# Altium footprint library TrackCommanderCar_ControlPart.PcbLib: 56 footprints (part 1 of 4)
Each footprint in its own frame and in the unit in brackets; x right, y up, seen from the top. Pads: shape width x height; smd on the part's side, far side on the other; paste and mask are expansions set on the pad; w line width, h text height; cw(c..) or ccw(c..) is an arc to the next point about the centre after c.
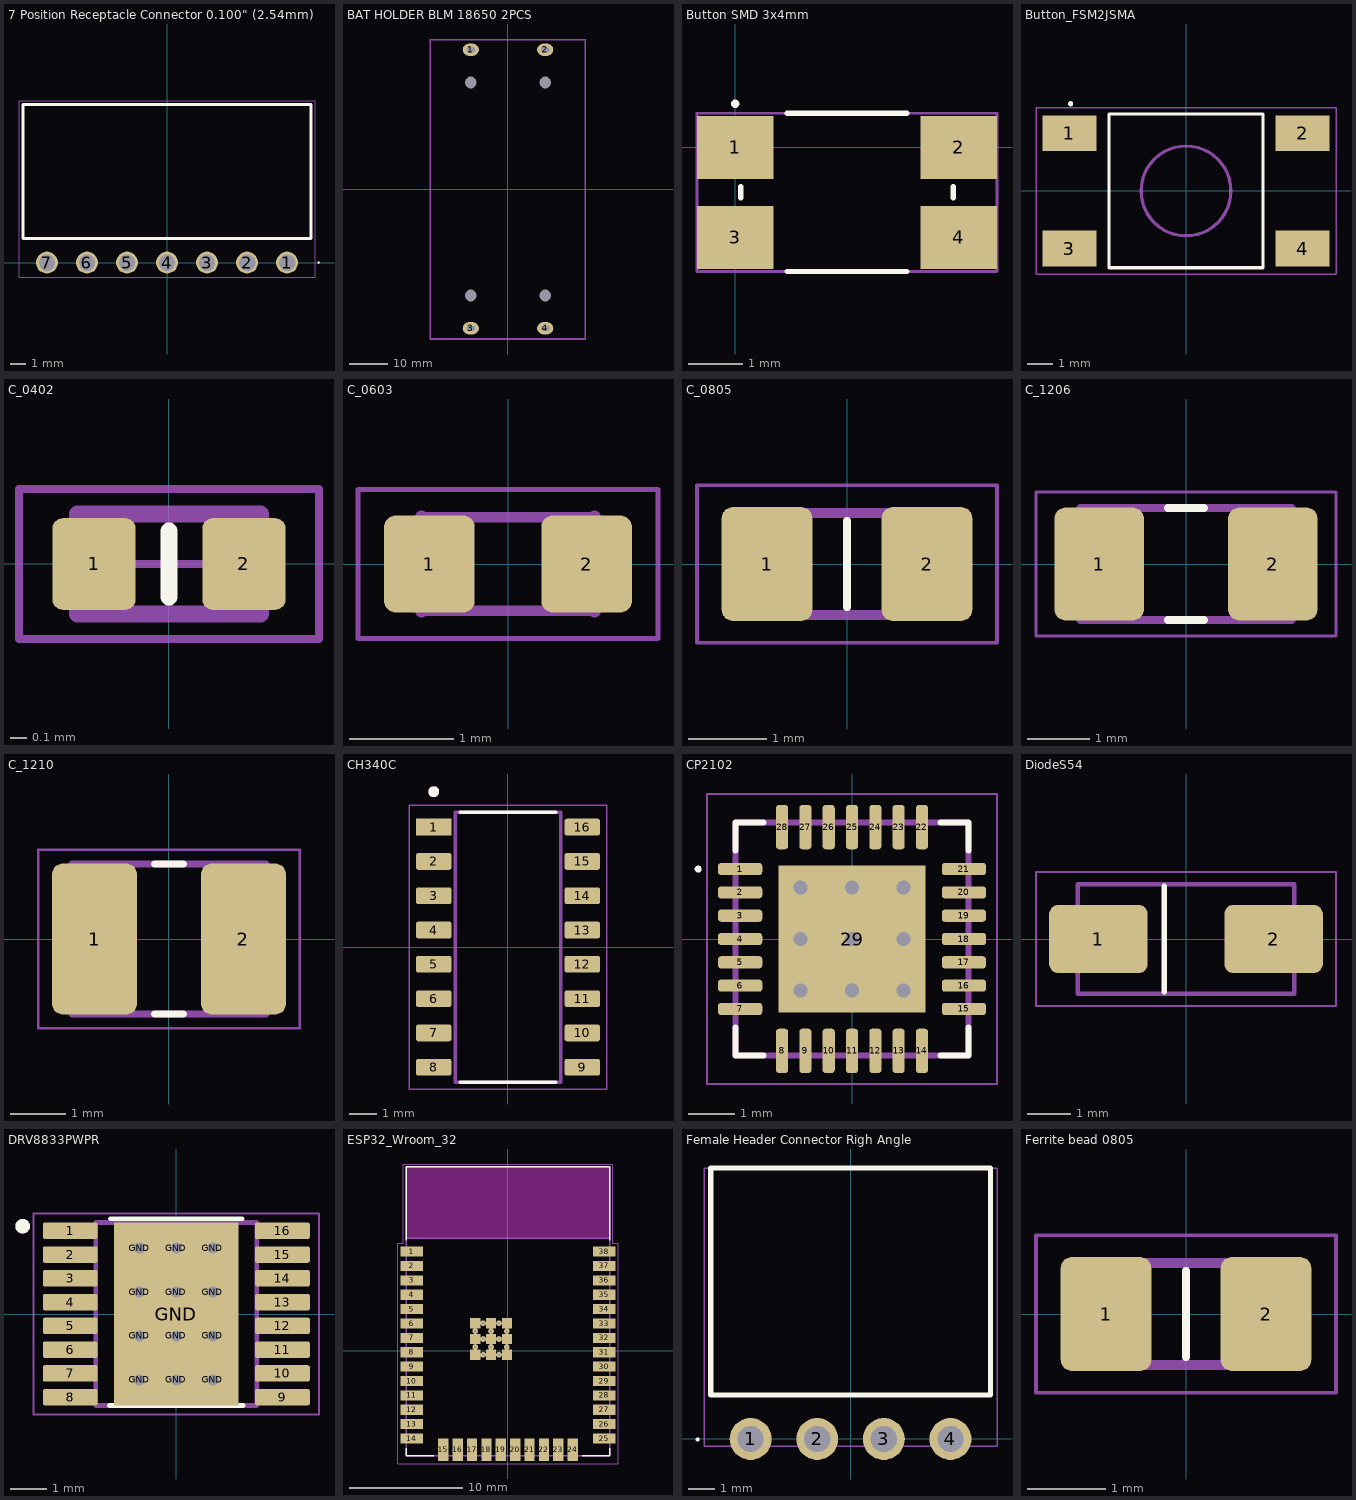
[diagram p0: the footprints below, top view; thin cyan lines are the x and y axes]

## 7 Position Receptacle Connector 0.100" (2.54mm) Through Hole, Right Angle [mm] "7 Position Receptacle Connector 0.100\" (2.54mm) Through Hole, Right Angle"
pads (7):
  round 1.39 hole 1.04: 1(7.62,0) 2(5.08,0) 3(2.54,0) 4(0,0) 5(-2.54,0) 6(-5.08,0) 7(-7.62,0)
Top Overlay:
  circle w0.1: c9.62,0 r0.025
  lines w0.2: -9.145,1.524 9.145,1.524 9.145,10.034 -9.145,10.034 -9.145,1.524
Top Assembly (Mech13):
  lines w0.1: -9.145,1.524 -9.145,10.034 ; -9.145,1.524 9.145,1.524 ; -9.145,1.524 -9.145,10.034 ; -9.145,10.034 9.145,10.034 ; -9.145,10.034 9.145,10.034 ; 9.145,1.524 9.145,10.034 ; 9.145,1.524 9.145,10.034
Mechanical 15:
  lines w0.05: -9.395,-0.945 9.395,-0.945 9.395,10.284 -9.395,10.284 -9.395,-0.945
3D body "SSW-107-02-T-S-RA.stp": height 2.46, standoff -2.48, extent -9.144,-0.203 9.144,10.033

## BAT HOLDER BLM 18650 2PCS [mm]
pads (8):
  oval 4.2x3.2 hole 1.2 slot 2.2 at 0 deg mask+0.07: 1(-9.7,36.3) 2(9.7,36.3) 3(-9.7,-36.3) 4(9.7,-36.3)
  round 0.55 hole 3.1 unplated mask+0.07: ""(-9.7,-27.8) ""(-9.7,27.8) ""(9.7,-27.8) ""(9.7,27.8)
Top Assembly (Mech13):
  lines w0.2: -20.1,-38.9 -20.1,38.9 20.1,38.9 20.1,-38.9 -20.1,-38.9
Mechanical 15:
  lines w0.15: -20.3,-39.1 -20.3,39.1 20.3,39.1 20.3,-39.1 -20.3,-39.1
3D body "Generic Li Ion 18650 cell.step": height 22.99, standoff 5.01, extent 0.5,-32.7 18.5,32.3
3D body "Generic Li Ion 18650 cell.step": height 22.99, standoff 5.01, extent -18.6,-32.7 -0.6,32.3
3D body "KLS5-18650-002-D.STEP": height 21, standoff -3.99, extent -20.1,-38.9 20.1,38.9

## Button SMD 3x4mm [mm] "Button SMD 3x4mm, Height 2.5 mm."
pads (4):
  rect 1.4x1.15 smd mask+0.1: 1(0,0) 2(4.1,0) 3(0,-1.65) 4(4.1,-1.65)
Top Overlay:
  circle w0.1: c0,0.8 r0.025
  lines w0.1: 0.1,-0.925 0.1,-0.725 ; 0.95,-2.275 3.15,-2.275 ; 0.95,0.625 3.15,0.625 ; 4,-0.925 4,-0.725
Mechanical 15:
  lines w0.05: -0.7,-2.275 4.8,-2.275 4.8,0.625 -0.7,0.625 -0.7,-2.275
  text ".Designator" at 0.63,-1.139 h0.6
3D body "KMR211NGLFS--3DModel-STEP-56544.STEP": height 1.9, standoff 0, extent -0.25,-2.225 4.35,0.575

## Button_FSM2JSMA [mm]
pads (4):
  rect 2.1x1.4 smd: 1(-4.55,2.25) 2(4.55,2.25) 3(-4.55,-2.25) 4(4.55,-2.25)
Top Overlay:
  circle w0.1: c-4.5,3.4 r0.05
  lines w0.127: -3,-3 3,-3 3,3 -3,3 -3,-3
Top Assembly (Mech13):
  circle w0.127: c0,0 r1.75
Mechanical 15:
  lines w0.05: -5.85,-3.25 5.85,-3.25 5.85,3.25 -5.85,3.25 -5.85,-3.25
3D body "step_temp.STEP": height 4.59, standoff 0, extent -5,-3 5,3

## C_0402 [mm]
pads (2):
  rrect25% 0.5x0.55 smd: 1(-0.45,0) 2(0.45,0)
Top Overlay:
  lines w0.1: 0,-0.2 0,0.2
Top Assembly:
  lines w0.1: -0.55,-0.3 -0.55,0.3 0.55,0.3 0.55,-0.3 -0.55,-0.3
Mechanical 15:
  lines w0.05: -0.275,0 0.275,0 ; 0,-0.275 0,0.275 ; -0.9,-0.45 0.9,-0.45 0.9,0.45 -0.9,0.45 -0.9,-0.45
  text ".Designator" at -1.27,-0.127 h0.6
3D body "CAPC1005X60N EIA 0402.STEP": height 0.6, standoff 0, extent -0.5,-0.25 0.5,0.25

## C_0603 [mm]
pads (2):
  rrect25% 0.87x0.93 smd mask+0.07: 1(-0.755,0) 2(0.755,0)
Top Assembly (Mech13):
  lines w0.1: -0.83,-0.45 0.83,-0.45 ; -0.83,0.45 0.83,0.45
  lines w0.127: -0.83,-0.45 -0.83,0.45 ; 0.83,-0.45 0.83,0.45
Mechanical 15:
  lines w0.05: -1.44,-0.715 1.44,-0.715 1.44,0.715 -1.44,0.715 -1.44,-0.715
3D body "step_temp.STEP": height 0.97, standoff 0, extent -0.8,-0.4 0.8,0.4

## C_0805 [mm]
pads (2):
  rrect25% 1.15x1.45 smd mask+0.07: 1(-1.016,0)
  rrect25% 1.15x1.45 smd paste-2539.97 mask+0.07: 2(1.016,0)
Top Overlay:
  lines w0.1: 0,-0.55 0,0.55
Top Paste:
  region: 0.441,-0.437 0.441,0.437 0.441,0.466 0.452,0.521 0.474,0.574 0.505,0.621 0.545,0.661 0.592,0.692 0.645,0.714 0.7,0.725 0.728,0.725 1.304,0.725 1.332,0.725 1.387,0.714 1.44,0.692 1.487,0.661 1.527,0.621 1.558,0.574 1.58,0.521 1.591,0.466 1.591,0.437 1.591,-0.437 1.591,-0.466 1.58,-0.521 1.558,-0.574 1.527,-0.621 1.487,-0.661 1.44,-0.692 1.387,-0.714 1.332,-0.725 1.304,-0.725 0.728,-0.725 0.7,-0.725 0.645,-0.714 0.592,-0.692 0.545,-0.661 0.505,-0.621 0.474,-0.574 0.452,-0.521 0.441,-0.466
Top Assembly (Mech13):
  region: -0.5,-0.65 -1,-0.65 -1,0.65 -0.5,0.65
  region: 1,-0.65 0.5,-0.65 0.5,0.65 1,0.65
  lines w0.127: -1,-0.65 1,-0.65 1,0.65 -1,0.65 -1,-0.65
Mechanical 15:
  lines w0.05: -1.905,-1 1.905,-1 1.905,1 -1.905,1 -1.905,-1
3D body "step_temp.STEP": height 1.52, standoff 0, extent -1.005,-0.625 1.005,0.625

## C_1206 [mm]
pads (2):
  rrect25% 1.44x1.82 smd mask+0.07: 1(-1.397,0) 2(1.397,0)
Top Overlay:
  lines w0.127: -0.29,-0.9 0.29,-0.9 ; -0.29,0.9 0.29,0.9
Top Assembly (Mech13):
  lines w0.127: -1.7,-0.9 -1.7,0.9 1.7,0.9 1.7,-0.9 -1.7,-0.9
Mechanical 15:
  lines w0.05: -2.413,-1.158 -2.413,1.158 2.413,1.158 2.413,-1.158 -2.413,-1.158
3D body "step_temp.STEP": height 1.9, standoff 0, extent -1.6,-0.8 1.6,0.8

## C_1210 [mm]
pads (2):
  rrect25% 1.53x2.72 smd mask+0.07: 1(-1.341,0) 2(1.341,0)
Top Overlay:
  lines w0.127: -0.26,-1.35 0.26,-1.35 ; -0.26,1.35 0.26,1.35
Top Assembly (Mech13):
  lines w0.127: -1.75,-1.35 -1.75,1.35 1.75,1.35 1.75,-1.35 -1.75,-1.35
Mechanical 15:
  lines w0.05: -2.355,-1.608 -2.355,1.608 2.355,1.608 2.355,-1.608 -2.355,-1.608
3D body "step_temp.STEP": height 2.65, standoff 0, extent -1.6,-1.25 1.6,1.25

## CH340C [mm]
pads (16):
  rect 1.31x0.62 smd: 1(-2.75,4.445)
  rrect25% 1.31x0.62 smd: 2(-2.75,3.175) 3(-2.75,1.905) 4(-2.75,0.635) 5(-2.75,-0.635) 6(-2.75,-1.905) 7(-2.75,-3.175) 8(-2.75,-4.445) 9(2.75,-4.445) 10(2.75,-3.175) 11(2.75,-1.905) 12(2.75,-0.635) 13(2.75,0.635) 14(2.75,1.905) 15(2.75,3.175) 16(2.75,4.445)
Top Overlay:
  circle w0.2: c-2.75,5.755 r0.1
  lines w0.127: -1.775,-5 1.775,-5 -1.775,-5 ; -1.775,5 1.775,5 -1.775,5
Top Assembly (Mech13):
  circle w0.2: c-2.75,5.755 r0.1
  lines w0.127: -1.95,-5 1.95,-5 1.95,5 -1.95,5 -1.95,-5
Mechanical 15:
  lines w0.05: -3.655,-5.25 -3.655,5.25 3.655,5.25 3.655,-5.25 -3.655,-5.25
3D body "step_temp.STEP": height 1.8, standoff 0, extent -3,-5 3,5

## CP2102 [mm]
pads (29):
  rrect50% 0.95x0.26 smd: 1(-2.4,1.5) 2(-2.4,1) 3(-2.4,0.5) 4(-2.4,0) 5(-2.4,-0.5) 6(-2.4,-1) 7(-2.4,-1.5) 15(2.4,-1.5) 16(2.4,-1) 17(2.4,-0.5) 18(2.4,0) 19(2.4,0.5) 20(2.4,1) 21(2.4,1.5)
  rrect50% 0.26x0.95 smd: 8(-1.5,-2.4) 9(-1,-2.4) 10(-0.5,-2.4) 11(0,-2.4) 12(0.5,-2.4) 13(1,-2.4) 14(1.5,-2.4) 22(1.5,2.4) 23(1,2.4) 24(0.5,2.4) 25(0,2.4) 26(-0.5,2.4) 27(-1,2.4) 28(-1.5,2.4)
  rect 3.15x3.15 smd paste-0.585: 29(0,0)
via -1.1,1.1 diameter 0.6 hole 0.3
via -1.1,-1.1 diameter 0.6 hole 0.3
via 0,-1.1 diameter 0.6 hole 0.3
via 1.1,-1.1 diameter 0.6 hole 0.3
via -1.1,0 diameter 0.6 hole 0.3
via 0,0 diameter 0.6 hole 0.3
via 1.1,0 diameter 0.6 hole 0.3
via 0,1.1 diameter 0.6 hole 0.3
via 1.1,1.1 diameter 0.6 hole 0.3
Top Overlay:
  circle w0.1: c-3.3,1.5 r0.025
  lines w0.127: -2.5,-1.9 -2.5,-2.5 -1.9,-2.5 ; -2.5,1.9 -2.5,2.5 -1.9,2.5 ; 1.9,-2.5 2.5,-2.5 2.5,-1.9 ; 1.9,2.5 2.5,2.5 2.5,1.9
Top Assembly (Mech13):
  lines w0.127: -2.5,-2.5 -2.5,2.5 2.5,2.5 2.5,-2.5 -2.5,-2.5
Mechanical 15:
  lines w0.05: -3.11,-3.11 -3.11,3.11 3.11,3.11 3.11,-3.11 -3.11,-3.11
3D body "step_temp.STEP": height 1, standoff 0, extent -2.5,-2.5 2.5,2.5

## DiodeS54 [mm]
pads (2):
  rrect25% 2.25x1.55 smd mask+0.07: 1(-2,0) 2(2,0)
Top Overlay:
  lines w0.127: -0.5,-1.2 -0.5,1.2
Top Assembly (Mech13):
  lines w0.1: -2.475,-1.25 -2.475,1.25 2.475,1.25 2.475,-1.25 -2.475,-1.25
Mechanical 15:
  lines w0.05: -3.425,-1.53 3.425,-1.53 3.425,1.53 -3.425,1.53 -3.425,-1.53
3D body "step_temp.STEP": height 2.2, standoff 0, extent -2.475,-1.25 2.475,1.25

## DRV8833PWPR [mm]
pads (29):
  rrect25% 1.5x0.45 smd mask+0.05: 1(-2.9,2.275) 2(-2.9,1.625) 3(-2.9,0.975) 4(-2.9,0.325) 5(-2.9,-0.325) 6(-2.9,-0.975) 7(-2.9,-1.625) 8(-2.9,-2.275) 9(2.9,-2.275) 10(2.9,-1.625) 11(2.9,-0.975) 12(2.9,-0.325) 13(2.9,0.325) 14(2.9,0.975) 15(2.9,1.625) 16(2.9,2.275)
  round 0.6 hole 0.3 mask+0: GND(-1,-1.8) GND(-1,-0.6) GND(-1,0.6) GND(-1,1.8) GND(0,-1.8) GND(0,-0.6) GND(0,0.6) GND(0,1.8) GND(1,-1.8) GND(1,-0.6) GND(1,0.6) GND(1,1.8)
  rect 3.4x5 smd paste-2539.97 mask+0: GND(0,0)
Top Overlay:
  circle w0.2: c-4.2,2.4 r0.1
  lines w0.127: -1.83,-2.5 1.83,-2.5 ; -1.8,2.6 1.8,2.6
Top Paste:
  region: 1.23,-1.155 -1.23,-1.155 -1.23,1.155 1.23,1.155
Top Solder:
  region: 1.23,-1.155 -1.23,-1.155 -1.23,1.155 1.23,1.155
Top Assembly (Mech13):
  circle w0.2: c-4.2,2.4 r0.1
  lines w0.127: -2.2,-2.5 2.2,-2.5 2.2,2.5 -2.2,2.5 -2.2,-2.5
Mechanical 15:
  lines w0.05: -3.9,-2.75 3.9,-2.75 3.9,2.75 -3.9,2.75 -3.9,-2.75
3D body "step_temp.STEP": height 1.2, standoff 0, extent -3.2,-2.5 3.2,2.5

## ESP32_Wroom_32 [mm]
pads (59):
  rect 2x0.9 smd mask+0.07: 1(-8.5,8.755) 2(-8.5,7.485) 3(-8.5,6.215) 4(-8.5,4.945) 5(-8.5,3.675) 6(-8.5,2.405) 7(-8.5,1.135) 8(-8.5,-0.135) 9(-8.5,-1.405) 10(-8.5,-2.675) 11(-8.5,-3.945) 12(-8.5,-5.215) 13(-8.5,-6.485) 14(-8.5,-7.755) 25(8.5,-7.755) 26(8.5,-6.485) 27(8.5,-5.215) 28(8.5,-3.945) 29(8.5,-2.675) 30(8.5,-1.405) 31(8.5,-0.135) 32(8.5,1.135) 33(8.5,2.405) 34(8.5,3.675) 35(8.5,4.945) 36(8.5,6.215) 37(8.5,7.485) 38(8.5,8.755)
  rect 0.9x2 smd mask+0.07: 15(-5.715,-8.755) 16(-4.445,-8.755) 17(-3.175,-8.755) 18(-1.905,-8.755) 19(-0.635,-8.755) 20(0.635,-8.755) 21(1.905,-8.755) 22(3.175,-8.755) 23(4.445,-8.755) 24(5.715,-8.755)
  rect 0.9x0.9 smd: GND(-2.897,-0.362) GND(-2.897,1.035) GND(-2.897,2.432) GND(-1.5,-0.362) GND(-1.5,1.035) GND(-1.5,2.432) GND(-0.097,-0.362) GND(-0.097,1.035) GND(-0.097,2.432)
  round 0.5 hole 0.2: GND(-2.897,0.332) GND(-2.897,1.732) GND(-2.197,-0.362) GND(-2.197,1.035) GND(-2.197,2.432) GND(-1.5,0.332) GND(-1.5,1.732) GND(-0.797,-0.362) GND(-0.797,1.035) GND(-0.797,2.432) GND(-0.097,0.332) GND(-0.097,1.732)
Top Overlay:
  lines w0.127: -9,-8.605 -9,-9.255 -6.55,-9.255 ; -9,9.745 -9,16.245 9,16.245 9,9.745 ; 6.55,-9.255 9,-9.255 9,-8.605
Keep-Out Layer:
  region: 9,9.945 -9,9.945 -9,16.245 9,16.245
  region: 9,9.945 -9,9.945 -9,16.245 9,16.245
Top Assembly (Mech13):
  lines w0.127: -9,9.945 -9,-9.255 9,-9.255 9,9.945 ; -9,9.945 -9,16.245 9,16.245 9,9.945 ; -9,9.945 9,9.945
Mechanical 15:
  lines w0.05: -9.75,-10.005 9.75,-10.005 9.75,9.495 9.25,9.495 9.25,16.495 -9.25,16.495 -9.25,9.495 -9.75,9.495 -9.75,-10.005
3D body "step_temp.STEP": height 3.2, standoff 0, extent -9,-9.255 9,16.245

## Female Header Connector Righ Angle [mm]
pads (4):
  round 1.6 hole 1 mask+0.102: 1(-3.81,0) 2(-1.27,0) 3(1.27,0) 4(3.81,0)
Top Overlay:
  circle w0.1: c-5.83,-0.02 r0.025
  lines w0.2: -5.335,1.68 -5.335,10.33 5.335,10.33 5.335,1.68 -5.335,1.68
Mechanical 15:
  lines w0.05: -5.585,-0.27 -5.585,10.33 5.585,10.33 5.585,-0.27 -5.585,-0.27
3D body "PPPC041LGBN-RC--3DModel-STEP-269445.STEP": height 2.54, standoff -3.15, extent -5.325,-0.139 5.335,10.161

## Ferrite bead 0805 [mm]
pads (2):
  rrect25% 1.15x1.45 smd mask+0.07: 1(-1.016,0)
  rrect25% 1.15x1.45 smd paste-2539.97 mask+0.07: 2(1.016,0)
Top Overlay:
  lines w0.1: 0,-0.55 0,0.55
Top Paste:
  region: 0.441,-0.437 0.441,0.438 0.441,0.466 0.452,0.521 0.474,0.574 0.505,0.621 0.545,0.661 0.592,0.692 0.645,0.714 0.7,0.725 0.728,0.725 1.304,0.725 1.332,0.725 1.387,0.714 1.44,0.692 1.487,0.661 1.527,0.621 1.558,0.574 1.58,0.521 1.591,0.466 1.591,0.438 1.591,-0.437 1.591,-0.466 1.58,-0.521 1.558,-0.574 1.527,-0.621 1.487,-0.661 1.44,-0.692 1.387,-0.714 1.332,-0.725 1.304,-0.725 0.728,-0.725 0.7,-0.725 0.645,-0.714 0.592,-0.692 0.545,-0.661 0.505,-0.621 0.474,-0.574 0.452,-0.521 0.441,-0.466
Top Assembly (Mech13):
  region: 1,-0.65 0.5,-0.65 0.5,0.65 1,0.65
  region: -0.5,-0.65 -1,-0.65 -1,0.65 -0.5,0.65
  lines w0.127: -1,-0.65 -1,0.65 1,0.65 1,-0.65 -1,-0.65
Mechanical 15:
  lines w0.05: -1.905,-1 -1.905,1 1.905,1 1.905,-1 -1.905,-1
3D body "FB.STEP": height 1.05, standoff 0, extent -1,-0.625 1,0.625